# Altium footprint library ICS.PcbLib: 74 footprints (part 4 of 5)
Each footprint in its own frame and in the unit in brackets; x right, y up, seen from the top. Pads: shape width x height; smd on the part's side, far side on the other; paste and mask are expansions set on the pad; w line width, h text height; cw(c..) or ccw(c..) is an arc to the next point about the centre after c.
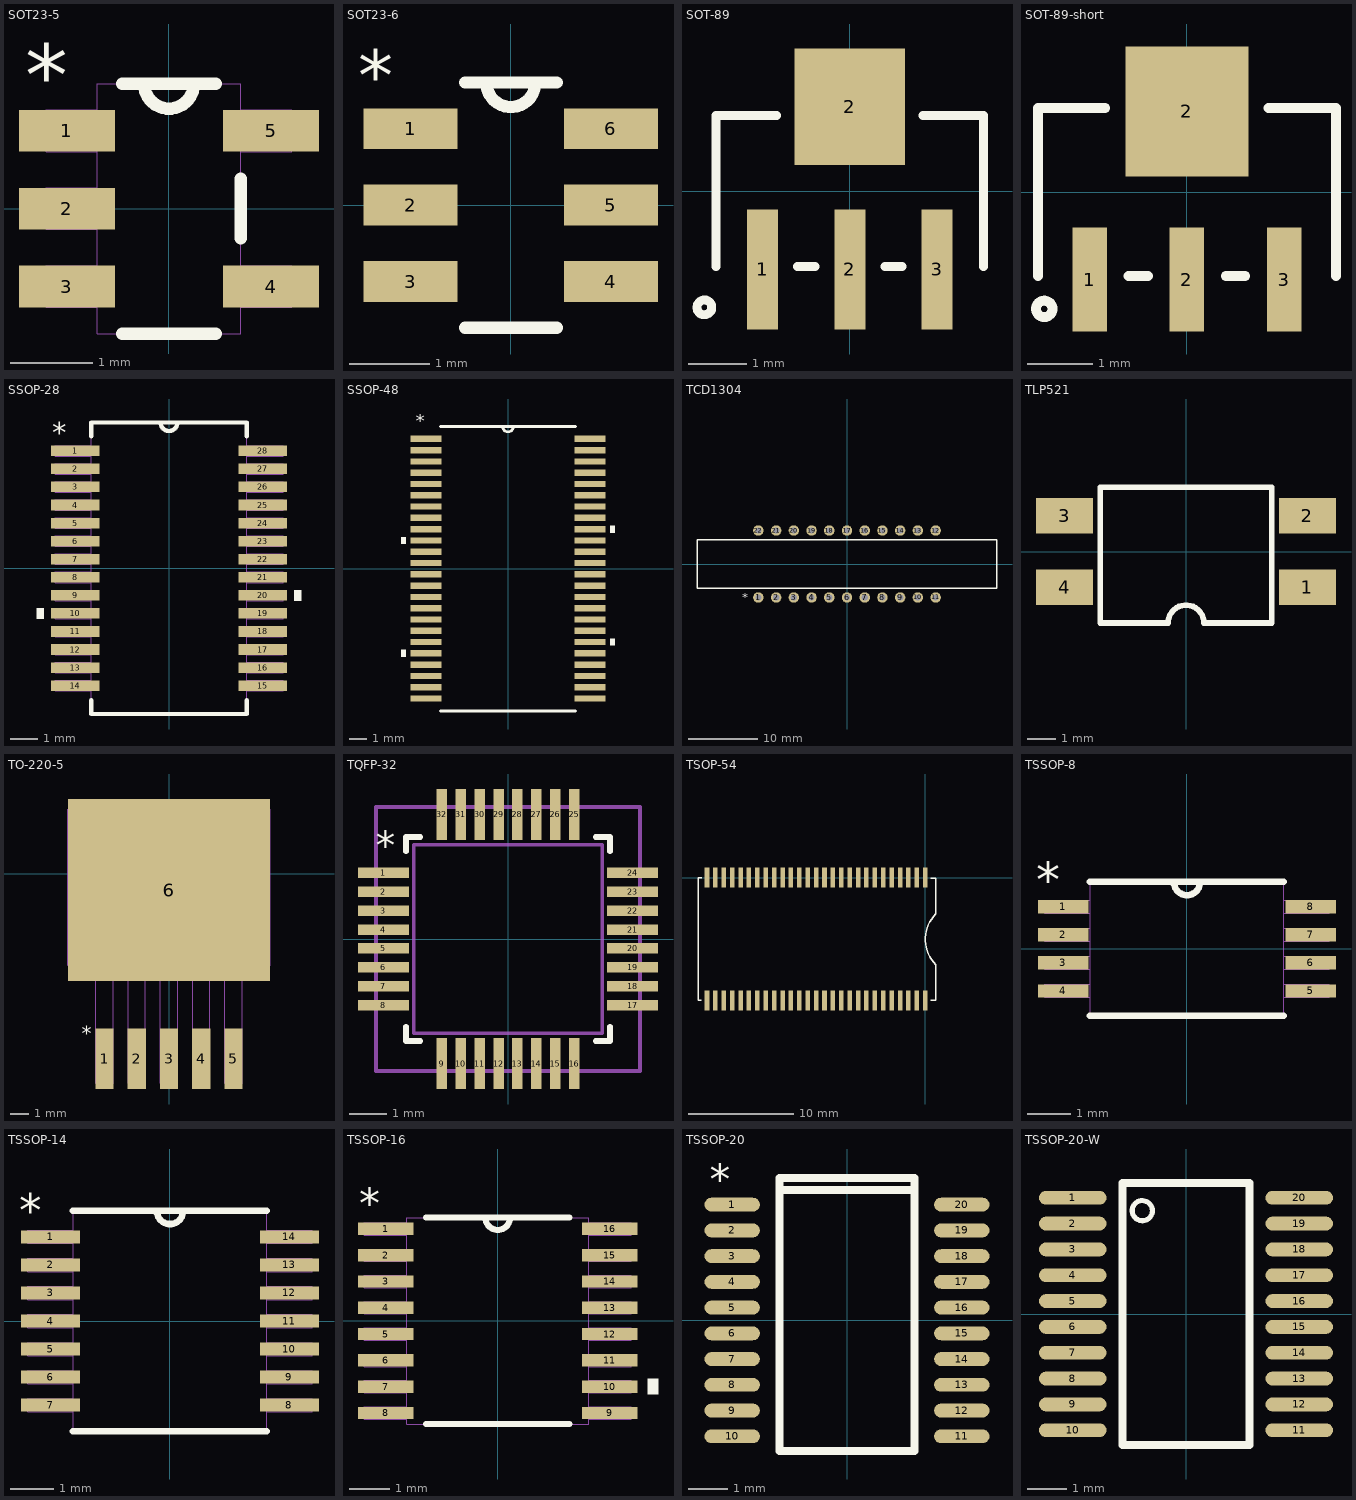
[diagram p3: the footprints below, top view; thin cyan lines are the x and y axes]

## SOT23-5 [mil]
pads (5):
  rect 46x20 smd: 1(-49,37.4) 2(-49,0) 3(-49,-37.4) 4(49,-37.4) 5(49,37.4)
Top Overlay:
  lines w6: -22.41,-60 22.41,-60 ; -22.41,60 22.41,60 ; -12,60 ccw(c0,60) 12,60 ; 34.5,-14.3 34.5,14.3
  text "*" at -68.9,49.21 h30
Mechanical 1:
  lines w0: -12,60 ccw(c0,60) 12,60 ; -59,-47.4 -34.5,-47.4 -34.5,-27.4 -59,-27.4 -59,-47.4 ; -59,-10 -34.5,-10 -34.5,10 -59,10 -59,-10 ; -59,27.4 -34.5,27.4 -34.5,47.4 -59,47.4 -59,27.4 ; -34.5,-60 -34.5,60 34.5,60 34.5,-60 -34.5,-60 ; 34.5,-47.4 59,-47.4 59,-27.4 34.5,-27.4 34.5,-47.4 ; 34.5,27.4 59,27.4 59,47.4 34.5,47.4 34.5,27.4
3D body: height 43.4, standoff 0.6, extent -56,-57.51 56,57.49

## SOT23-6 [mil]
pads (6):
  rect 46x20 smd: 1(-49,37.4) 2(-49,0) 3(-49,-37.4) 4(49,-37.4) 5(48.99,0) 6(49,37.4)
Top Overlay:
  lines w6: -22.41,-60 22.41,-60 ; -22.41,60 22.41,60 ; -12,60 ccw(c0,60) 12,60
  text "*" at -74.8,51.18 h25
3D body: height 44.21, standoff 0.6, extent -56.01,-57.5 55.99,57.5

## SOT-89 [mil]
pads (4):
  rect 21x81 smd: 1(-59.06,-53.06) 2(0,-53.06) 3(59.06,-53.06)
  rect 74.8x78.74 smd: 2(0,56.91)
Top Overlay:
  circle w6: c-98.43,-78.74 r5
  lines w6: -90.5,-51 -90.5,51 -49.6,51 ; -35.46,-51 -23.6,-51 ; 23.6,-51 35.46,-51 ; 49.6,51 90.5,51 90.5,-51
3D body: height 63.99, standoff 0.6, extent -90.54,-81.92 90.56,85.4

## SOT-89-short [mm]
pads (4):
  rect 0.533x1.6 smd: 1(-1.5,-1.348) 2(0,-1.348) 3(1.5,-1.348)
  rect 1.9x2 smd: 2(0,1.245)
Top Overlay:
  circle w0.152: c-2.2,-1.8 r0.127
  lines w0.152: -2.299,-1.295 -2.299,1.295 -1.26,1.295 ; -0.901,-1.295 -0.599,-1.295 ; 0.599,-1.295 0.901,-1.295 ; 1.26,1.295 2.299,1.295 2.299,-1.295
3D body: height 1.63, standoff 0.02, extent -2.3,-2.081 2.3,2.169

## SSOP-28 [mil]
pads (28):
  rect 69x15 smd: 1(-133,166.34) 2(-133,140.75) 3(-133,115.16) 4(-133,89.57) 5(-133,63.98) 6(-133,38.39) 7(-133,12.8) 8(-133,-12.8) 9(-133,-38.39) 10(-133,-63.98) 11(-133,-89.57) 12(-133,-115.16) 13(-133,-140.75) 14(-133,-166.34) 15(133,-166.34) 16(133,-140.75) 17(133,-115.16) 18(133,-89.57) 19(133,-63.98) 20(133,-38.39) 21(133,-12.8) 22(133,12.8) 23(133,38.39) 24(133,63.98) 25(133,89.57) 26(133,115.16) 27(133,140.75) 28(133,166.34)
Top Overlay:
  region: -177.5,-56.48 -187.5,-56.48 -187.5,-71.48 -177.5,-71.48
  region: 177.5,-30.89 187.5,-30.89 187.5,-45.89 177.5,-45.89
  lines w6: -110,-186.94 -110,-206.5 110,-206.5 110,-186.94 ; -110,186.94 -110,206.5 110,206.5 110,186.94 ; -12,206.5 ccw(c0,206.5) 12,206.5
  text "*" at -165.35,177.17 h30
Mechanical 1:
  lines w0: -12,206.5 ccw(c0,206.5) 12,206.5 ; -161.5,-173.84 -161.5,-158.84 -110,-158.84 -110,-173.84 -161.5,-173.84 ; -161.5,-148.25 -161.5,-133.25 -110,-133.25 -110,-148.25 -161.5,-148.25 ; -161.5,-122.66 -161.5,-107.66 -110,-107.66 -110,-122.66 -161.5,-122.66 ; -161.5,-97.07 -161.5,-82.07 -110,-82.07 -110,-97.07 -161.5,-97.07 ; -161.5,-71.48 -161.5,-56.48 -110,-56.48 -110,-71.48 -161.5,-71.48 ; -161.5,-45.89 -161.5,-30.89 -110,-30.89 -110,-45.89 -161.5,-45.89 ; -161.5,-20.3 -161.5,-5.3 -110,-5.3 -110,-20.3 -161.5,-20.3 ; -161.5,5.3 -161.5,20.3 -110,20.3 -110,5.3 -161.5,5.3 ; -161.5,30.89 -161.5,45.89 -110,45.89 -110,30.89 -161.5,30.89 ; -161.5,56.48 -161.5,71.48 -110,71.48 -110,56.48 -161.5,56.48 ; -161.5,82.07 -161.5,97.07 -110,97.07 -110,82.07 -161.5,82.07 ; -161.5,107.66 -161.5,122.66 -110,122.66 -110,107.66 -161.5,107.66 ; -161.5,133.25 -161.5,148.25 -110,148.25 -110,133.25 -161.5,133.25 ; -161.5,158.84 -161.5,173.84 -110,173.84 -110,158.84 -161.5,158.84 ; -110,-206.5 110,-206.5 110,206.5 -110,206.5 -110,-206.5 ; 110,-173.84 110,-158.84 161.5,-158.84 161.5,-173.84 110,-173.84 ; 110,-148.25 110,-133.25 161.5,-133.25 161.5,-148.25 110,-148.25 ; 110,-122.66 110,-107.66 161.5,-107.66 161.5,-122.66 110,-122.66 ; 110,-97.07 110,-82.07 161.5,-82.07 161.5,-97.07 110,-97.07 ; 110,-71.48 110,-56.48 161.5,-56.48 161.5,-71.48 110,-71.48 ; 110,-45.89 110,-30.89 161.5,-30.89 161.5,-45.89 110,-45.89 ; 110,-20.3 110,-5.3 161.5,-5.3 161.5,-20.3 110,-20.3 ; 110,5.3 110,20.3 161.5,20.3 161.5,5.3 110,5.3 ; 110,30.89 110,45.89 161.5,45.89 161.5,30.89 110,30.89 ; 110,56.48 110,71.48 161.5,71.48 161.5,56.48 110,56.48 ; 110,82.07 110,97.07 161.5,97.07 161.5,82.07 110,82.07 ; 110,107.66 110,122.66 161.5,122.66 161.5,107.66 110,107.66 ; 110,133.25 110,148.25 161.5,148.25 161.5,133.25 110,133.25 ; 110,158.84 110,173.84 161.5,173.84 161.5,158.84 110,158.84
3D body: height 76.98, standoff 0.6, extent -154.06,-200.78 154.07,200.79

## SSOP-48 [mil]
pads (48):
  rect 68.5x14 smd: 1(-181.75,287.5) 2(-181.75,262.5) 3(-181.75,237.5) 4(-181.75,212.5) 5(-181.75,187.5) 6(-181.75,162.5) 7(-181.75,137.5) 8(-181.75,112.5) 9(-181.75,87.5) 10(-181.75,62.5) 11(-181.75,37.5) 12(-181.75,12.5) 13(-181.75,-12.5) 14(-181.75,-37.5) 15(-181.75,-62.5) 16(-181.75,-87.5) 17(-181.75,-112.5) 18(-181.75,-137.5) 19(-181.75,-162.5) 20(-181.75,-187.5) 21(-181.75,-212.5) 22(-181.75,-237.5) 23(-181.75,-262.5) 24(-181.75,-287.5) 25(181.75,-287.5) 26(181.75,-262.5) 27(181.75,-237.5) 28(181.75,-212.5) 29(181.75,-187.5) 30(181.75,-162.5) 31(181.75,-137.5) 32(181.75,-112.5) 33(181.75,-87.5) 34(181.75,-62.5) 35(181.75,-37.5) 36(181.75,-12.5) 37(181.75,12.5) 38(181.75,37.5) 39(181.75,62.5) 40(181.75,87.5) 41(181.75,112.5) 42(181.75,137.5) 43(181.75,162.5) 44(181.75,187.5) 45(181.75,212.5) 46(181.75,237.5) 47(181.75,262.5) 48(181.75,287.5)
Top Overlay:
  region: 226,95 236,95 236,80 226,80
  region: 226,-155 236,-155 236,-170 226,-170
  region: -226,-180 -236,-180 -236,-195 -226,-195
  region: -226,70 -236,70 -236,55 -226,55
  lines w6: -149.5,-315 149.5,-315 ; -149.5,315 149.5,315 ; -12,315 ccw(c0,315) 12,315
  text "*" at -203.74,312.5 h30
3D body: height 102.21, standoff 0.6, extent -203.74,-312.5 203.76,312.5

## TCD1304 [mm] "Connector; Header; 11x2 Position"
pads (22):
  round 1.5 hole 0.9: 1(-12.7,-4.8) 2(-10.16,-4.8) 3(-7.62,-4.8) 4(-5.08,-4.8) 5(-2.54,-4.8) 6(0,-4.8) 7(2.54,-4.8) 8(5.08,-4.8) 9(7.62,-4.8) 10(10.16,-4.8) 11(12.7,-4.8) 12(12.7,4.8) 13(10.16,4.8) 14(7.62,4.8) 15(5.08,4.8) 16(2.54,4.8) 17(0,4.8) 18(-2.54,4.8) 19(-5.08,4.8) 20(-7.62,4.8) 21(-10.16,4.8) 22(-12.7,4.8)
Top Overlay:
  lines w0.2: -21.5,-3.5 21.5,-3.5 21.5,3.5 -21.5,3.5 -21.5,-3.5
  text "*" at -15,-5.5 h1.27

## TLP521 [mil]
height 47.24
pads (4):
  rect 80x50 smd: 1(170,-50) 2(170,50) 3(-170,50) 4(-170,-50)
Top Overlay:
  lines w8: -120,-100 -120,90 120,90 120,-100 25,-100 ccw(c0,-100) -25,-100 -120,-100

## TO-220-5 [mm]
pads (6):
  rect 0.965x3.2 smd: 1(-3.4,-9.752) 2(-1.7,-9.752) 3(0,-9.752) 4(1.7,-9.752) 5(3.4,-9.752)
  rect 10.668x9.6 smd: 6(0,-0.848)
Top Overlay:
  text "*" at -4.6,-8.8 h0.76
Mechanical 1:
  lines w0: -5.334,-4.826 5.334,-4.826 5.334,3.426 -5.334,3.426 -5.334,-4.826 ; -3.857,-11.049 -3.857,-4.826 -2.943,-4.826 -2.943,-11.049 -3.857,-11.049 ; -2.157,-11.049 -2.157,-4.826 -1.243,-4.826 -1.243,-11.049 -2.157,-11.049 ; -0.457,-11.049 -0.457,-4.826 0.457,-4.826 0.457,-11.049 -0.457,-11.049 ; 1.243,-11.049 1.243,-4.826 2.157,-4.826 2.157,-11.049 1.243,-11.049 ; 2.943,-11.049 2.943,-4.826 3.857,-4.826 3.857,-11.049 2.943,-11.049
3D body: height 4.58, standoff -0.14, extent -5.08,-11 5.08,3.3

## TQFP-32 [mm]
pads (32):
  rect 1.35x0.279 smd: 1(-3.3,1.75) 2(-3.3,1.25) 3(-3.3,0.75) 4(-3.3,0.25) 5(-3.3,-0.25) 6(-3.3,-0.75) 7(-3.3,-1.25) 8(-3.3,-1.75) 17(3.3,-1.75) 18(3.3,-1.25) 19(3.3,-0.75) 20(3.3,-0.25) 21(3.3,0.25) 22(3.3,0.75) 23(3.3,1.25) 24(3.3,1.75)
  rect 0.279x1.35 smd: 9(-1.75,-3.3) 10(-1.25,-3.3) 11(-0.75,-3.3) 12(-0.25,-3.3) 13(0.25,-3.3) 14(0.75,-3.3) 15(1.25,-3.3) 16(1.75,-3.3) 25(1.75,3.3) 26(1.25,3.3) 27(0.75,3.3) 28(0.25,3.3) 29(-0.25,3.3) 30(-0.75,3.3) 31(-1.25,3.3) 32(-1.75,3.3)
Top Overlay:
  lines w0.152: -2.7,-2.328 -2.7,-2.7 -2.328,-2.7 ; -2.7,2.328 -2.7,2.7 -2.328,2.7 ; 2.328,-2.7 2.7,-2.7 2.7,-2.328 ; 2.328,2.7 2.7,2.7 2.7,2.328
  text "*" at -3.5,2.1 h0.76
Mechanical 13:
  lines w0.1: -3.5,-3.5 3.5,-3.5 3.5,3.5 -3.5,3.5 -3.5,-3.5 ; -2.5,-2.5 -2.5,2.5 2.5,2.5 2.5,-2.5 -2.5,-2.5

## TSOP-54 [mil]
height 62.99
pads (54):
  rect 17x75 smd: 1(0,0) 2(-31.5,0) 3(-62.99,0) 4(-94.49,0) 5(-125.98,0) 6(-157.48,0) 7(-188.98,0) 8(-220.47,0) 9(-251.97,0) 10(-283.46,0) 11(-314.99,0) 12(-346.46,0) 13(-377.95,0) 14(-409.45,0) 15(-440.94,0) 16(-472.44,0) 17(-503.94,0) 18(-535.43,0) 19(-566.93,0) 20(-598.43,0) 21(-629.92,0) 22(-661.42,0) 23(-692.91,0) 24(-724.41,0) 25(-755.91,0) 26(-787.4,0) 27(-818.9,0) 28(-818.9,-460) 29(-787.4,-460) 30(-755.91,-460) 31(-724.41,-460) 32(-692.91,-460) 33(-661.42,-460) 34(-630,-460) 35(-598.43,-460) 36(-566.93,-460) 37(-535.43,-460) 38(-503.94,-460) 39(-472.44,-460) 40(-440.94,-460) 41(-409.45,-460) 42(-377.95,-460) 43(-346.46,-460) 44(-314.99,-460) 45(-283.46,-460) 46(-251.97,-460) 47(-220.47,-460) 48(-188.98,-460) 49(-157.48,-460) 50(-125.98,-460) 51(-94.49,-460) 52(-62.99,-460) 53(-31.5,-460) 54(0,-460)
Top Overlay:
  lines w5: -840,-460 -852,-460 -852,0 -838,0 ; 20,-460 40,-460 40,-326 cw(c135,-231) 40,-136 40,-2 20,-2

## TSSOP-8 [mil]
pads (8):
  rect 46x12 smd: 1(-113,38.39) 2(-113,12.8) 3(-113,-12.8) 4(-113,-38.39) 5(113,-38.39) 6(113,-12.8) 7(113,12.8) 8(113,38.39)
Top Overlay:
  lines w6: -88.5,-61 88.5,-61 ; -88.5,61 88.5,61 ; -12,61 ccw(c0,61) 12,61
  text "*" at -137.8,47.24 h32
Mechanical 1:
  lines w0: -12,61 ccw(c0,61) 12,61 ; -130,-44.39 -130,-32.39 -88.5,-32.39 -88.5,-44.39 -130,-44.39 ; -130,-18.8 -130,-6.8 -88.5,-6.8 -88.5,-18.8 -130,-18.8 ; -130,6.8 -130,18.8 -88.5,18.8 -88.5,6.8 -130,6.8 ; -130,32.39 -130,44.39 -88.5,44.39 -88.5,32.39 -130,32.39 ; -88.5,-61 88.5,-61 88.5,61 -88.5,61 -88.5,-61 ; 88.5,-44.39 88.5,-32.39 130,-32.39 130,-44.39 88.5,-44.39 ; 88.5,-18.8 88.5,-6.8 130,-6.8 130,-18.8 88.5,-18.8 ; 88.5,6.8 88.5,18.8 130,18.8 130,6.8 88.5,6.8 ; 88.5,32.39 88.5,44.39 130,44.39 130,32.39 88.5,32.39
3D body: height 43.46, standoff 0.48, extent -125.98,-59.06 125.98,59.05

## TSSOP-14 [mil]
pads (14):
  rect 54x12 smd: 1(-109,76.77) 2(-109,51.18) 3(-109,25.59) 4(-109,0) 5(-109,-25.59) 6(-109,-51.18) 7(-109,-76.77) 8(109,-76.77) 9(109,-51.18) 10(109,-25.59) 11(109,0) 12(109,25.59) 13(109,51.18) 14(109,76.77)
Top Overlay:
  lines w6: -88.5,-100.5 88.5,-100.5 ; -88.5,100.5 88.5,100.5 ; -12,100.5 ccw(c0,100.5) 12,100.5
  text "*" at -137.8,86.61 h30
Mechanical 1:
  lines w0: -12,100.5 ccw(c0,100.5) 12,100.5 ; -130,-82.77 -88.5,-82.77 -88.5,-70.77 -130,-70.77 -130,-82.77 ; -130,-57.18 -88.5,-57.18 -88.5,-45.18 -130,-45.18 -130,-57.18 ; -130,-31.59 -88.5,-31.59 -88.5,-19.59 -130,-19.59 -130,-31.59 ; -130,-6 -88.5,-6 -88.5,6 -130,6 -130,-6 ; -130,19.59 -88.5,19.59 -88.5,31.59 -130,31.59 -130,19.59 ; -130,45.18 -88.5,45.18 -88.5,57.18 -130,57.18 -130,45.18 ; -130,70.77 -88.5,70.77 -88.5,82.77 -130,82.77 -130,70.77 ; -88.5,-100.5 -88.5,100.5 88.5,100.5 88.5,-100.5 -88.5,-100.5 ; 88.5,-82.77 130,-82.77 130,-70.77 88.5,-70.77 88.5,-82.77 ; 88.5,-57.18 130,-57.18 130,-45.18 88.5,-45.18 88.5,-57.18 ; 88.5,-31.59 130,-31.59 130,-19.59 88.5,-19.59 88.5,-31.59 ; 88.5,-6 130,-6 130,6 88.5,6 88.5,-6 ; 88.5,19.59 130,19.59 130,31.59 88.5,31.59 88.5,19.59 ; 88.5,45.18 130,45.18 130,57.18 88.5,57.18 88.5,45.18 ; 88.5,70.77 130,70.77 130,82.77 88.5,82.77 88.5,70.77

## TSSOP-16 [mil]
pads (16):
  rect 54x12 smd: 1(-109,89.57) 2(-109,63.98) 3(-109,38.39) 4(-109,12.8) 5(-109,-12.8) 6(-109,-38.39) 7(-109,-63.98) 8(-109,-89.57) 9(109,-89.57) 10(109,-63.98) 11(109,-38.39) 12(109,-12.8) 13(109,12.8) 14(109,38.39) 15(109,63.98) 16(109,89.57)
Top Overlay:
  region: 146,-56.48 156,-56.48 156,-71.48 146,-71.48
  lines w6: -69.86,-100.5 69.86,-100.5 ; -69.86,100.5 69.86,100.5 ; -12,100.5 ccw(c0,100.5) 12,100.5
  text "*" at -135,100 h30
Mechanical 1:
  lines w0: -12,100.5 ccw(c0,100.5) 12,100.5 ; -130,-95.57 -88.5,-95.57 -88.5,-83.57 -130,-83.57 -130,-95.57 ; -130,-69.98 -88.5,-69.98 -88.5,-57.98 -130,-57.98 -130,-69.98 ; -130,-44.39 -88.5,-44.39 -88.5,-32.39 -130,-32.39 -130,-44.39 ; -130,-18.8 -88.5,-18.8 -88.5,-6.8 -130,-6.8 -130,-18.8 ; -130,6.8 -88.5,6.8 -88.5,18.8 -130,18.8 -130,6.8 ; -130,32.39 -88.5,32.39 -88.5,44.39 -130,44.39 -130,32.39 ; -130,57.98 -88.5,57.98 -88.5,69.98 -130,69.98 -130,57.98 ; -130,83.57 -88.5,83.57 -88.5,95.57 -130,95.57 -130,83.57 ; -88.5,-100.5 -88.5,100.5 88.5,100.5 88.5,-100.5 -88.5,-100.5 ; 88.5,-95.57 130,-95.57 130,-83.57 88.5,-83.57 88.5,-95.57 ; 88.5,-69.98 130,-69.98 130,-57.98 88.5,-57.98 88.5,-69.98 ; 88.5,-44.39 130,-44.39 130,-32.39 88.5,-32.39 88.5,-44.39 ; 88.5,-18.8 130,-18.8 130,-6.8 88.5,-6.8 88.5,-18.8 ; 88.5,6.8 130,6.8 130,18.8 88.5,18.8 88.5,6.8 ; 88.5,32.39 130,32.39 130,44.39 88.5,44.39 88.5,32.39 ; 88.5,57.98 130,57.98 130,69.98 88.5,69.98 88.5,57.98 ; 88.5,83.57 130,83.57 130,95.57 88.5,95.57 88.5,83.57
3D body: height 39.58, standoff 0.6, extent -126.39,-98.42 126.38,98.43

## TSSOP-20 [mm]
pads (20):
  oval 1.4x0.35 smd paste-0.102 mask+0.051: 1(-2.9,2.925) 2(-2.9,2.275) 3(-2.9,1.625) 4(-2.9,0.975) 5(-2.9,0.325) 6(-2.9,-0.325) 7(-2.9,-0.975) 8(-2.9,-1.625) 9(-2.9,-2.275) 10(-2.9,-2.925) 11(2.9,-2.925) 12(2.9,-2.275) 13(2.9,-1.625) 14(2.9,-0.975) 15(2.9,-0.325) 16(2.9,0.325) 17(2.9,0.975) 18(2.9,1.625) 19(2.9,2.275) 20(2.9,2.925)
Top Overlay:
  lines w0.2: -1.7,3.3 1.7,3.3 ; -1.7,-3.3 1.7,-3.3 1.7,3.6 -1.7,3.6 -1.7,-3.3
  text "*" at -3.46,3.19 h0.76
3D body: height 1.01, standoff 0.02, extent -3.21,-3.25 3.21,3.25

## TSSOP-20-W [mm]
pads (20):
  oval 1.7x0.35 smd paste-0.102 mask+0.051: 1(-2.85,2.925) 2(-2.85,2.275) 3(-2.85,1.625) 4(-2.85,0.975) 5(-2.85,0.325) 6(-2.85,-0.325) 7(-2.85,-0.975) 8(-2.85,-1.625) 9(-2.85,-2.275) 10(-2.85,-2.925) 11(2.85,-2.925) 12(2.85,-2.275) 13(2.85,-1.625) 14(2.85,-0.975) 15(2.85,-0.325) 16(2.85,0.325) 17(2.85,0.975) 18(2.85,1.625) 19(2.85,2.275) 20(2.85,2.925)
Top Overlay:
  circle w0.127: c-1.1,2.6 r0.254
  lines w0.2: -1.6,-3.3 1.6,-3.3 1.6,3.3 -1.6,3.3 -1.6,-3.3
3D body: height 1.01, standoff 0.02, extent -3.21,-3.25 3.21,3.25